# Altium footprint library 全库.PcbLib: 967 footprints (part 26 of 61)
Each footprint in its own frame and in the unit in brackets; x right, y up, seen from the top. Pads: shape width x height; smd on the part's side, far side on the other; paste and mask are expansions set on the pad; w line width, h text height; cw(c..) or ccw(c..) is an arc to the next point about the centre after c.
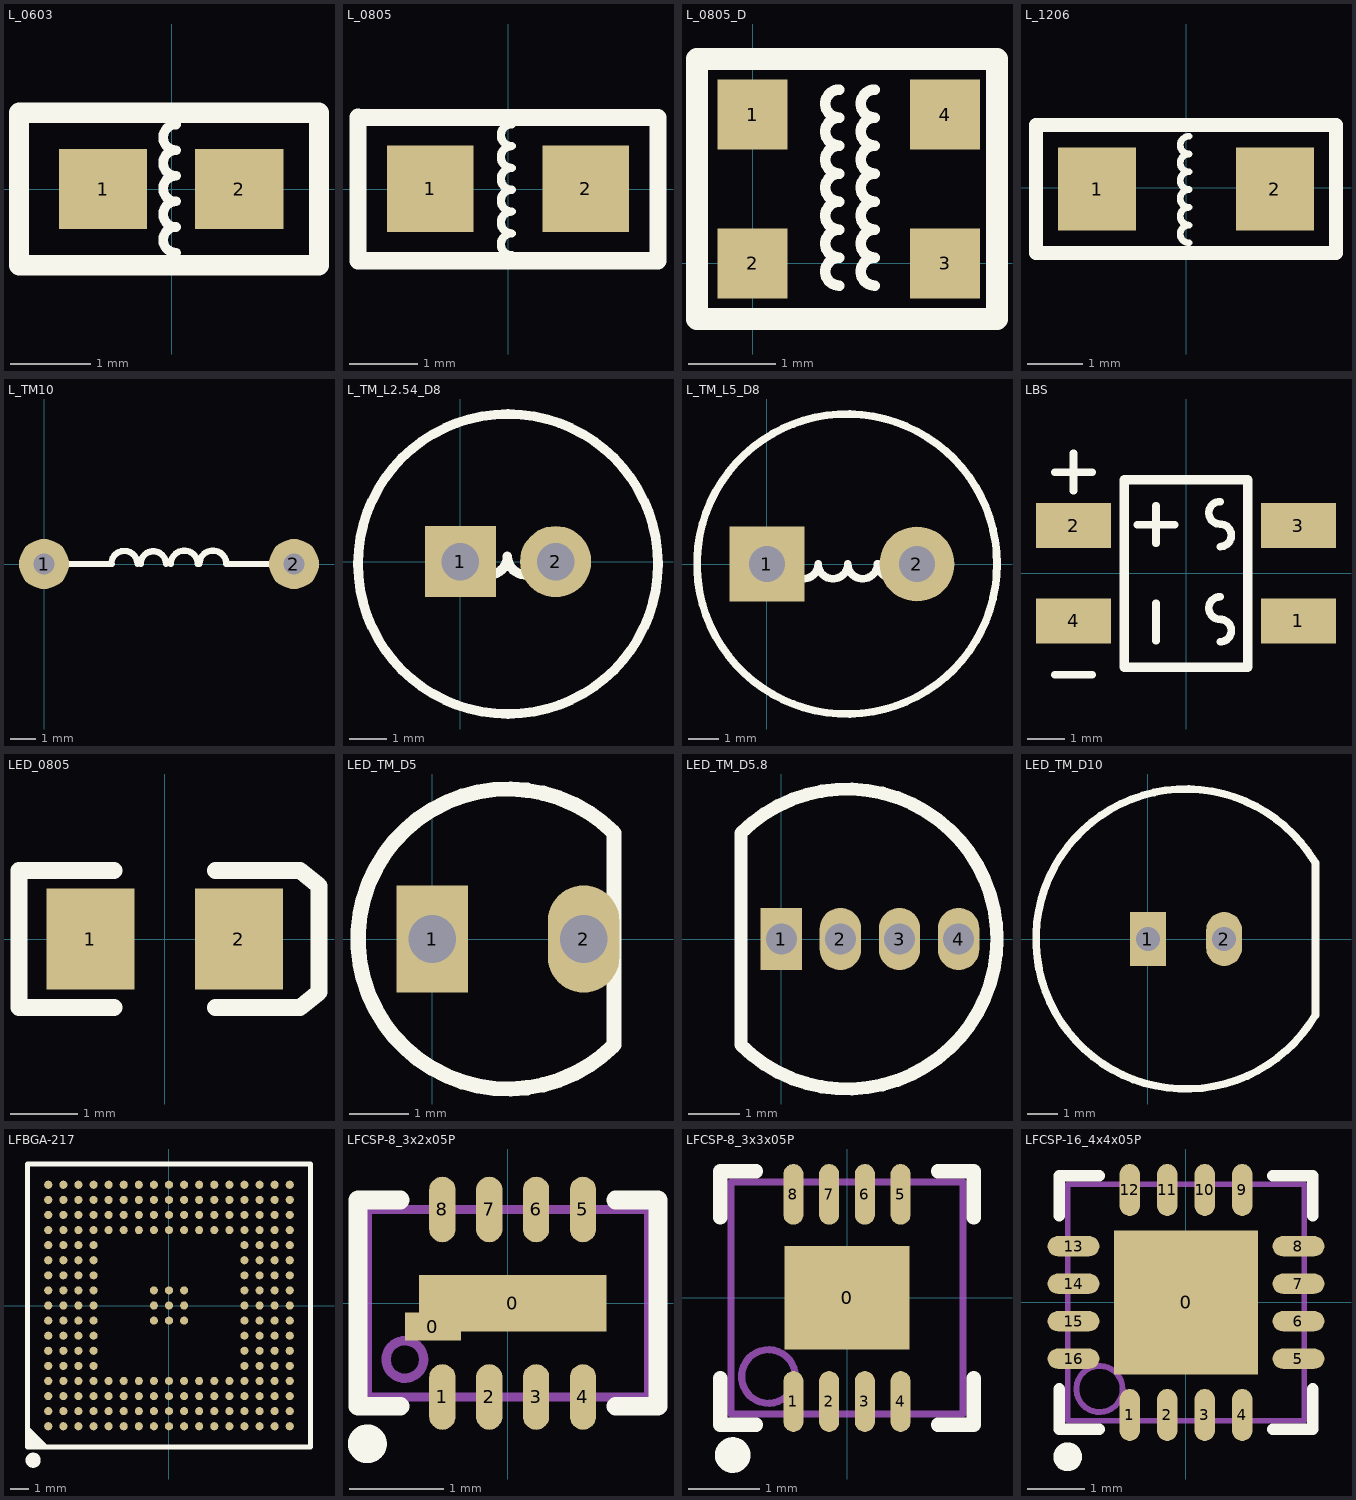
[diagram p25: the footprints below, top view; thin cyan lines are the x and y axes]

## L_0603 [mm]
pads (2):
  rect 1.1x1 smd: 1(-0.855,0) 2(0.845,0)
Top Overlay:
  lines w0.12: 0.055,-0.795 cw(c0.055,-0.635) 0.055,-0.475 cw(c0.055,-0.315) 0.055,-0.155 cw(c0.055,0.005) 0.055,0.165 cw(c0.055,0.325) 0.055,0.485 cw(c0.055,0.645) 0.055,0.805
  lines w0.254: -1.905,-0.953 1.841,-0.953 1.841,0.953 -1.905,0.953 -1.905,-0.953

## L_0805 [mil]
pads (2):
  rect 50x50 smd: 1(-45,0.25) 2(45,0.25)
Top Overlay:
  lines w4.72: 2.17,-38.19 cw(c2.17,-31.89) 2.17,-25.59 cw(c2.17,-19.29) 2.17,-12.99 cw(c2.17,-6.69) 2.17,-0.39 cw(c2.17,5.91) 2.17,12.2 cw(c2.17,18.5) 2.17,24.8 cw(c2.17,31.1) 2.17,37.4
  lines w10: -86.61,-41.34 86.61,-41.34 86.61,41.34 -86.61,41.34 ; -86.61,-41.28 -86.61,41.4

## L_0805_D [mm]
pads (4):
  rect 0.8x0.8 smd: 1(0,1.7) 2(0,0) 3(2.2,0) 4(2.2,1.7)
Top Overlay:
  lines w0.12: 0.991,-0.254 cw(c0.991,-0.094) 0.991,0.066 cw(c0.991,0.226) 0.991,0.386 cw(c0.991,0.546) 0.991,0.706 cw(c0.991,0.866) 0.991,1.026 cw(c0.991,1.186) 0.991,1.346 cw(c0.991,1.506) 0.991,1.666 cw(c0.991,1.826) 0.991,1.986 ; 1.397,-0.254 cw(c1.397,-0.094) 1.397,0.066 cw(c1.397,0.226) 1.397,0.386 cw(c1.397,0.546) 1.397,0.706 cw(c1.397,0.866) 1.397,1.026 cw(c1.397,1.186) 1.397,1.346 cw(c1.397,1.506) 1.397,1.666 cw(c1.397,1.826) 1.397,1.986
  lines w0.254: -0.635,-0.635 2.794,-0.635 2.794,2.337 -0.635,2.337 -0.635,-0.635

## L_1206 [mm]
pads (2):
  rect 1.4x1.5 smd: 1(-1.6,-0.02) 2(1.6,-0.02)
Top Overlay:
  lines w0.12: 0.055,-0.99 cw(c0.055,-0.83) 0.055,-0.67 cw(c0.055,-0.51) 0.055,-0.35 cw(c0.055,-0.19) 0.055,-0.03 cw(c0.055,0.13) 0.055,0.29 cw(c0.055,0.45) 0.055,0.61 cw(c0.055,0.77) 0.055,0.93
  lines w0.254: -2.7,-1.17 2.7,-1.17 2.7,1.13 -2.7,1.13 -2.7,-1.17

## L_TM10 [mm] "电感"
pads (2):
  round 2 hole 0.85: 1(0,0) 2(10,0)
Top Overlay:
  lines w0.254: 0.944,0 2.722,0 ; 2.691,0 cw(c3.214,0) 3.738,0 ; 3.865,0 cw(c4.373,0) 4.881,0 ; 5.073,0 cw(c5.612,0) 6.151,0 ; 6.216,0 cw(c6.755,0) 7.294,0 9.072,0

## L_TM_L2.54_D8 [mm]
pads (2):
  rect 1.9x1.9 hole 1: 1(0,0)
  round 1.9 hole 1: 2(2.54,0)
Top Overlay:
  circle w0.254: c1.27,-0.064 r4
  lines w0.254: -0.718,0.139 ccw(c-0.224,0.139) 0.269,0.139 ccw(c0.762,0.139) 1.255,0.139 ccw(c1.748,0.139) 2.241,0.139 ; 2.271,0.139 ccw(c2.764,0.139) 3.257,0.139

## L_TM_L5_D8 [mm]
pads (2):
  rect 2.5x2.5 hole 1.2: 1(0,0)
  round 2.5 hole 1.2: 2(5,0)
Top Overlay:
  circle w0.254: c2.667,0 r5
  lines w0.254: 0,0 0.72,0 ccw(c1.213,0) 1.706,0 ccw(c2.2,0) 2.693,0 ccw(c3.186,0) 3.679,0 ; 3.709,0 ccw(c4.202,0) 4.695,0 ; 5.076,0.127 5.889,0.127

## LBS [mm]
pads (4):
  rect 2x1.2 smd: 1(3,-1.27) 2(-3,1.27) 3(3,1.27) 4(-3,-1.27)
Top Overlay:
  lines w0.203: -3.5,-2.7 -2.5,-2.7 ; -3.5,2.7 -2.5,2.7 ; -3,2.2 -3,3.2 ; -1.3,1.3 -0.3,1.3 ; -0.8,-1.8 -0.8,-0.8 ; -0.8,0.8 -0.8,1.8 ; 0.908,-1.825 ccw(c0.908,-1.525) 0.908,-1.225 cw(c0.908,-0.925) 0.908,-0.625 ; 0.908,0.715 ccw(c0.908,1.015) 0.908,1.315 cw(c0.908,1.615) 0.908,1.915
  lines w0.254: -1.651,-2.5 1.651,-2.5 1.651,2.5 -1.651,2.5 -1.651,-2.5

## LED_0805 [mm]
pads (2):
  rect 1.3x1.5 smd: 1(-1.1,0) 2(1.1,0)
Top Overlay:
  lines w0.254: -0.75,-1.016 -2.159,-1.016 -2.159,1.016 -0.75,1.016 ; 0.75,-1.016 2,-1.016 2.286,-0.787 2.286,0.787 2,1.016 0.75,1.016

## LED_TM_D5 [mm]
pads (2):
  rect 1.2x1.8 hole 0.8: 1(0,0)
  oval 1.2x1.8 hole 0.8: 2(2.54,0)
Top Overlay:
  lines w0.254: 3.049,-1.779 cw(c1.27,0) 3.049,1.779 ; 3.05,-1.777 3.05,1.776

## LED_TM_D5.8 [mm]
pads (4):
  rect 0.8x1.2 hole 0.6: 1(0,0)
  oval 0.8x1.2 hole 0.6: 2(1.143,0) 3(2.286,0) 4(3.429,0)
Top Overlay:
  lines w0.254: -0.781,-2.051 ccw(c1.27,0) -0.781,2.051 -0.781,-2.051

## LED_TM_D10 [mm]
pads (2):
  rect 1.2x1.8 hole 0.8: 1(0,0)
  oval 1.2x1.8 hole 0.8: 2(2.54,0)
Top Overlay:
  lines w0.254: 5.557,2.572 ccw(c1.27,0) 5.589,-2.519 ; 5.588,-2.54 5.588,2.54

## LFBGA-217 [mm]
pads (217):
  round 0.43 smd mask+0.051: A1(-6.4,-6.4) A2(-6.4,-5.6) A3(-6.4,-4.8) A4(-6.4,-4) A5(-6.4,-3.2) A6(-6.4,-2.4) A7(-6.4,-1.6) A8(-6.4,-0.8) A9(-6.4,0) A10(-6.4,0.8) A11(-6.4,1.6) A12(-6.4,2.4) A13(-6.4,3.2) A14(-6.4,4) A15(-6.4,4.8) A16(-6.4,5.6) A17(-6.4,6.4) B1(-5.6,-6.4) B2(-5.6,-5.6) B3(-5.6,-4.8) B4(-5.6,-4) B5(-5.6,-3.2) B6(-5.6,-2.4) B7(-5.6,-1.6) B8(-5.6,-0.8) B9(-5.6,0) B10(-5.6,0.8) B11(-5.6,1.6) B12(-5.6,2.4) B13(-5.6,3.2) B14(-5.6,4) B15(-5.6,4.8) B16(-5.6,5.6) B17(-5.6,6.4) C1(-4.8,-6.4) C2(-4.8,-5.6) C3(-4.8,-4.8) C4(-4.8,-4) C5(-4.8,-3.2) C6(-4.8,-2.4) C7(-4.8,-1.6) C8(-4.8,-0.8) C9(-4.8,0) C10(-4.8,0.8) C11(-4.8,1.6) C12(-4.8,2.4) C13(-4.8,3.2) C14(-4.8,4) C15(-4.8,4.8) C16(-4.8,5.6) C17(-4.8,6.4) D1(-4,-6.4) D2(-4,-5.6) D3(-4,-4.8) D4(-4,-4) D5(-4,-3.2) D6(-4,-2.4) D7(-4,-1.6) D8(-4,-0.8) D9(-4,0) D10(-4,0.8) D11(-4,1.6) D12(-4,2.4) D13(-4,3.2) D14(-4,4) D15(-4,4.8) D16(-4,5.6) D17(-4,6.4) E1(-3.2,-6.4) E2(-3.2,-5.6) E3(-3.2,-4.8) E4(-3.2,-4) E14(-3.2,4) E15(-3.2,4.8) E16(-3.2,5.6) E17(-3.2,6.4) F1(-2.4,-6.4) F2(-2.4,-5.6) F3(-2.4,-4.8) F4(-2.4,-4) F14(-2.4,4) F15(-2.4,4.8) F16(-2.4,5.6) F17(-2.4,6.4) G1(-1.6,-6.4) G2(-1.6,-5.6) G3(-1.6,-4.8) G4(-1.6,-4) G14(-1.6,4) G15(-1.6,4.8) G16(-1.6,5.6) G17(-1.6,6.4) H1(-0.8,-6.4) H2(-0.8,-5.6) H3(-0.8,-4.8) H4(-0.8,-4) H8(-0.8,-0.8) H9(-0.8,0) H10(-0.8,0.8) H14(-0.8,4) H15(-0.8,4.8) H16(-0.8,5.6) H17(-0.8,6.4) J1(0,-6.4) J2(0,-5.6) J3(0,-4.8) J4(0,-4) J8(0,-0.8) J9(0,0) J10(0,0.8) J14(0,4) J15(0,4.8) J16(0,5.6) J17(0,6.4) K1(0.8,-6.4) K2(0.8,-5.6) K3(0.8,-4.8) K4(0.8,-4) K8(0.8,-0.8) K9(0.8,0) K10(0.8,0.8) K14(0.8,4) K15(0.8,4.8) K16(0.8,5.6) K17(0.8,6.4) L1(1.6,-6.4) L2(1.6,-5.6) L3(1.6,-4.8) L4(1.6,-4) L14(1.6,4) L15(1.6,4.8) L16(1.6,5.6) L17(1.6,6.4) M1(2.4,-6.4) M2(2.4,-5.6) M3(2.4,-4.8) M4(2.4,-4) M14(2.4,4) M15(2.4,4.8) M16(2.4,5.6) M17(2.4,6.4) N1(3.2,-6.4) N2(3.2,-5.6) N3(3.2,-4.8) N4(3.2,-4) N14(3.2,4) N15(3.2,4.8) N16(3.2,5.6) N17(3.2,6.4) P1(4,-6.4) P2(4,-5.6) P3(4,-4.8) P4(4,-4) P5(4,-3.2) P6(4,-2.4) P7(4,-1.6) P8(4,-0.8) P9(4,0) P10(4,0.8) P11(4,1.6) P12(4,2.4) P13(4,3.2) P14(4,4) P15(4,4.8) P16(4,5.6) P17(4,6.4) R1(4.8,-6.4) R2(4.8,-5.6) R3(4.8,-4.8) R4(4.8,-4) R5(4.8,-3.2) R6(4.8,-2.4) R7(4.8,-1.6) R8(4.8,-0.8) R9(4.8,0) R10(4.8,0.8) R11(4.8,1.6) R12(4.8,2.4) R13(4.8,3.2) R14(4.8,4) R15(4.8,4.8) R16(4.8,5.6) R17(4.8,6.4) T1(5.6,-6.4) T2(5.6,-5.6) T3(5.6,-4.8) T4(5.6,-4) T5(5.6,-3.2) T6(5.6,-2.4) T7(5.6,-1.6) T8(5.6,-0.8) T9(5.6,0) T10(5.6,0.8) T11(5.6,1.6) T12(5.6,2.4) T13(5.6,3.2) T14(5.6,4) T15(5.6,4.8) T16(5.6,5.6) T17(5.6,6.4) U1(6.4,-6.4) U2(6.4,-5.6) U3(6.4,-4.8) U4(6.4,-4) U5(6.4,-3.2) U6(6.4,-2.4) U7(6.4,-1.6) U8(6.4,-0.8) U9(6.4,0) U10(6.4,0.8) U11(6.4,1.6) U12(6.4,2.4) U13(6.4,3.2) U14(6.4,4) U15(6.4,4.8) U16(6.4,5.6) U17(6.4,6.4)
Top Overlay:
  circle w0.4: c-7.2,-8.2 r0.2
  region: -7.5,-6.5 -6.5,-7.5 -7.5,-7.5
  lines w0.2: -7.5,-6.5 -6.5,-7.5
  lines w0.254: -7.5,-7.5 -7.5,7.5 7.5,7.5 7.5,-7.5 -7.5,-7.5
Mechanical 13:
  lines w0.1: -7.5,-7.5 -7.5,7.5 7.5,7.5 7.5,-7.5 -7.5,-7.5

## LFCSP-8_3x2x05P [mm]
pads (10):
  rect 0.6x0.3 smd mask+0.051: 0(-0.8,-0.25)
  rect 2x0.6 smd mask+0.051: 0(0.05,0)
  oval 0.28x0.7 smd mask+0.051: 1(-0.7,-1) 2(-0.2,-1) 3(0.3,-1) 4(0.8,-1) 5(0.8,1) 6(0.3,1) 7(-0.2,1) 8(-0.7,1)
Top Overlay:
  circle w0.254: c-1.5,-1.5 r0.08
  lines w0.2: -1.15,-1.1 -1.6,-1.1 -1.6,1.1 -1.15,1.1 ; 1.15,-1.1 1.6,-1.1 1.6,1.1 1.15,1.1
Mechanical 13:
  circle w0.1: c-1.1,-0.6 r0.2
  lines w0.1: -1.5,-1 1.5,-1 1.5,1 -1.5,1 -1.5,-1

## LFCSP-8_3x3x05P [mm]
pads (9):
  rect 1.75x1.45 smd mask+0.051: 0(0,0)
  oval 0.28x0.85 smd mask+0.051: 1(-0.75,-1.45) 2(-0.25,-1.45) 3(0.25,-1.45) 4(0.75,-1.45) 5(0.75,1.45) 6(0.25,1.45) 7(-0.25,1.45) 8(-0.75,1.45)
Top Overlay:
  circle w0.25: c-1.6,-2.2 r0.125
  lines w0.2: -1.775,-1.125 -1.775,-1.775 -1.275,-1.775 ; -1.775,1.125 -1.775,1.775 -1.275,1.775 ; 1.275,-1.775 1.775,-1.775 1.775,-1.125 ; 1.275,1.775 1.775,1.775 1.775,1.125
Mechanical 13:
  circle w0.1: c-1.1,-1.1 r0.376
  lines w0.1: -1.625,-1.625 1.625,-1.625 1.625,1.625 -1.625,1.625 -1.625,-1.625

## LFCSP-16_4x4x05P [mm]
pads (18):
  rect 2.5x2.5 smd paste-1.225 mask+0.051: 0(0,0)
  oval 0.35x0.9 smd mask+0.051: 1(-0.975,-1.95) 2(-0.325,-1.95) 3(0.325,-1.95) 4(0.975,-1.95) 9(0.975,1.95) 10(0.325,1.95) 11(-0.325,1.95) 12(-0.975,1.95)
  oval 0.9x0.35 smd mask+0.051: 5(1.95,-0.975) 6(1.95,-0.325) 7(1.95,0.325) 8(1.95,0.975) 13(-1.95,0.975) 14(-1.95,0.325) 15(-1.95,-0.325) 16(-1.95,-0.975)
  rect 2.5x2.5 smd mask+0.051: ""(0,0)
Top Overlay:
  circle w0.25: c-2.05,-2.675 r0.125
  lines w0.2: -2.2,-1.5 -2.2,-2.2 -1.5,-2.2 ; -2.2,1.5 -2.2,2.2 -1.5,2.2 ; 1.5,-2.2 2.2,-2.2 2.2,-1.5 ; 1.5,2.2 2.2,2.2 2.2,1.5
Mechanical 13:
  circle w0.1: c-1.5,-1.5 r0.4
  lines w0.1: -2.05,-2.05 -2.05,2.05 2.05,2.05 2.05,-2.05 -2.05,-2.05